# Altium footprint library Indruino.PcbLib: 383 footprints (part 15 of 24)
Each footprint in its own frame and in the unit in brackets; x right, y up, seen from the top. Pads: shape width x height; smd on the part's side, far side on the other; paste and mask are expansions set on the pad; w line width, h text height; cw(c..) or ccw(c..) is an arc to the next point about the centre after c.
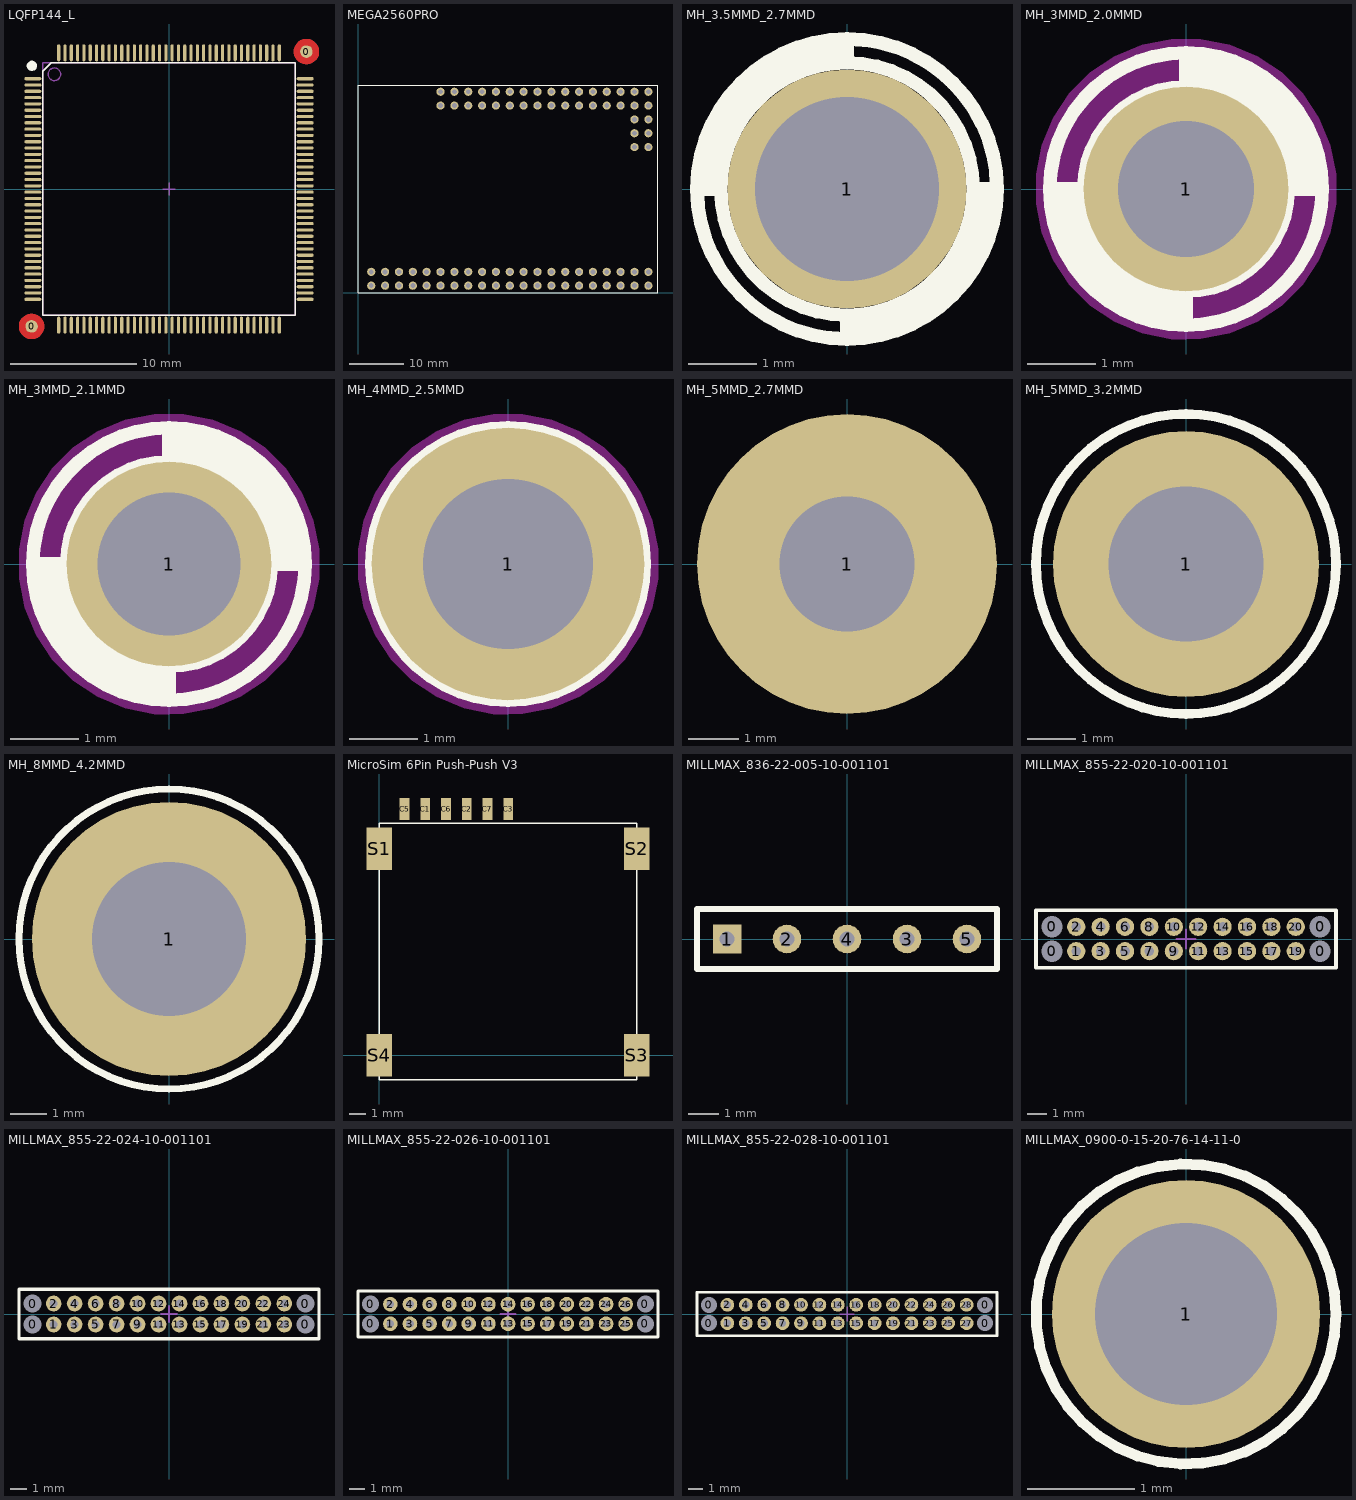
[diagram p14: the footprints below, top view; thin cyan lines are the x and y axes]

## LQFP144_L [mm] "Thin QFP, 144-Leads, Body 20x20mm, Pitch 0.5mm, IPC High Density"
height 1.6
pads (146):
  round 1 smd mask+0.5: 0(-10.9,-10.9) 0(10.9,10.9)
  oval 1.35x0.25 smd: 1(-10.8,8.75) 2(-10.8,8.25) 3(-10.8,7.75) 4(-10.8,7.25) 5(-10.8,6.75) 6(-10.8,6.25) 7(-10.8,5.75) 8(-10.8,5.25) 9(-10.8,4.75) 10(-10.8,4.25) 11(-10.8,3.75) 12(-10.8,3.25) 13(-10.8,2.75) 14(-10.8,2.25) 15(-10.8,1.75) 16(-10.8,1.25) 17(-10.8,0.75) 18(-10.8,0.25) 19(-10.8,-0.25) 20(-10.8,-0.75) 21(-10.8,-1.25) 22(-10.8,-1.75) 23(-10.8,-2.25) 24(-10.8,-2.75) 25(-10.8,-3.25) 26(-10.8,-3.75) 27(-10.8,-4.25) 28(-10.8,-4.75) 29(-10.8,-5.25) 30(-10.8,-5.75) 31(-10.8,-6.25) 32(-10.8,-6.75) 33(-10.8,-7.25) 34(-10.8,-7.75) 35(-10.8,-8.25) 36(-10.8,-8.75) 73(10.8,-8.75) 74(10.8,-8.25) 75(10.8,-7.75) 76(10.8,-7.25) 77(10.8,-6.75) 78(10.8,-6.25) 79(10.8,-5.75) 80(10.8,-5.25) 81(10.8,-4.75) 82(10.8,-4.25) 83(10.8,-3.75) 84(10.8,-3.25) 85(10.8,-2.75) 86(10.8,-2.25) 87(10.8,-1.75) 88(10.8,-1.25) 89(10.8,-0.75) 90(10.8,-0.25) 91(10.8,0.25) 92(10.8,0.75) 93(10.8,1.25) 94(10.8,1.75) 95(10.8,2.25) 96(10.8,2.75) 97(10.8,3.25) 98(10.8,3.75) 99(10.8,4.25) 100(10.8,4.75) 101(10.8,5.25) 102(10.8,5.75) 103(10.8,6.25) 104(10.8,6.75) 105(10.8,7.25) 106(10.8,7.75) 107(10.8,8.25) 108(10.8,8.75)
  oval 0.25x1.35 smd: 37(-8.75,-10.8) 38(-8.25,-10.8) 39(-7.75,-10.8) 40(-7.25,-10.8) 41(-6.75,-10.8) 42(-6.25,-10.8) 43(-5.75,-10.8) 44(-5.25,-10.8) 45(-4.75,-10.8) 46(-4.25,-10.8) 47(-3.75,-10.8) 48(-3.25,-10.8) 49(-2.75,-10.8) 50(-2.25,-10.8) 51(-1.75,-10.8) 52(-1.25,-10.8) 53(-0.75,-10.8) 54(-0.25,-10.8) 55(0.25,-10.8) 56(0.75,-10.8) 57(1.25,-10.8) 58(1.75,-10.8) 59(2.25,-10.8) 60(2.75,-10.8) 61(3.25,-10.8) 62(3.75,-10.8) 63(4.25,-10.8) 64(4.75,-10.8) 65(5.25,-10.8) 66(5.75,-10.8) 67(6.25,-10.8) 68(6.75,-10.8) 69(7.25,-10.8) 70(7.75,-10.8) 71(8.25,-10.8) 72(8.75,-10.8) 109(8.75,10.8) 110(8.25,10.8) 111(7.75,10.8) 112(7.25,10.8) 113(6.75,10.8) 114(6.25,10.8) 115(5.75,10.8) 116(5.25,10.8) 117(4.75,10.8) 118(4.25,10.8) 119(3.75,10.8) 120(3.25,10.8) 121(2.75,10.8) 122(2.25,10.8) 123(1.75,10.8) 124(1.25,10.8) 125(0.75,10.8) 126(0.25,10.8) 127(-0.25,10.8) 128(-0.75,10.8) 129(-1.25,10.8) 130(-1.75,10.8) 131(-2.25,10.8) 132(-2.75,10.8) 133(-3.25,10.8) 134(-3.75,10.8) 135(-4.25,10.8) 136(-4.75,10.8) 137(-5.25,10.8) 138(-5.75,10.8) 139(-6.25,10.8) 140(-6.75,10.8) 141(-7.25,10.8) 142(-7.75,10.8) 143(-8.25,10.8) 144(-8.75,10.8)
Top Layer:
  pour cut-out: -10.9,-9.9 -10.802,-9.9 -10.608,-9.938 -10.426,-10.014 -10.263,-10.123 -10.123,-10.263 -10.014,-10.426 -9.938,-10.608 -9.9,-10.802 -9.9,-10.9 -9.9,-10.998 -9.938,-11.192 -10.014,-11.374 -10.123,-11.537 -10.263,-11.677 -10.426,-11.786 -10.608,-11.862 -10.802,-11.9 -10.9,-11.9 -10.998,-11.9 -11.192,-11.862 -11.374,-11.786 -11.537,-11.677 -11.677,-11.537 -11.786,-11.374 -11.862,-11.192 -11.9,-10.998 -11.9,-10.9 -11.9,-10.802 -11.862,-10.608 -11.786,-10.426 -11.677,-10.263 -11.537,-10.123 -11.374,-10.014 -11.192,-9.938 -10.998,-9.9
  pour cut-out: 10.9,9.9 10.802,9.9 10.608,9.938 10.426,10.014 10.263,10.123 10.123,10.263 10.014,10.426 9.938,10.608 9.9,10.802 9.9,10.9 9.9,10.998 9.938,11.192 10.014,11.374 10.123,11.537 10.263,11.677 10.426,11.786 10.608,11.862 10.802,11.9 10.9,11.9 10.998,11.9 11.192,11.862 11.374,11.786 11.537,11.677 11.677,11.537 11.786,11.374 11.862,11.192 11.9,10.998 11.9,10.9 11.9,10.802 11.862,10.608 11.786,10.426 11.677,10.263 11.537,10.123 11.374,10.014 11.192,9.938 10.998,9.9
Top Overlay:
  region: -10.878,9.367 -10.957,9.367 -11.104,9.428 -11.217,9.541 -11.278,9.688 -11.278,9.767 -11.278,9.847 -11.217,9.994 -11.104,10.107 -10.957,10.167 -10.878,10.167 -10.798,10.167 -10.651,10.107 -10.539,9.994 -10.478,9.847 -10.478,9.767 -10.478,9.688 -10.539,9.541 -10.651,9.428 -10.798,9.367
  lines w0.1: -10,-10 10,-10 10,10 -9.35,10 -10,9.35 -10,-10
Mechanical 13:
  circle w0.1: c-9.1,9.1 r0.5
  lines w0.1: -10,-10 -10,10 10,10 10,-10 -10,-10
Mechanical 15:
  lines w0.1: -0.5,0 0.5,0 ; 0,-0.5 0,0.5
3D body "User Library-LQFP144-0_5.STEP": height 1.56, standoff -0.01, extent -10.886,-10.886 10.886,10.886

## MEGA2560PRO [mm]
pads (80):
  round 1.5 hole 0.9: 3V3@1(10.05,1.28) 3V3@2(10.05,3.82) 5V@1(7.51,1.28) 5V@2(7.51,3.82) A0(15.13,36.84) A1(15.13,34.3) A2(17.67,36.84) A3(17.67,34.3) A4(20.21,36.84) A5(20.21,34.3) A6(22.75,36.84) A7(22.75,34.3) A8(25.29,36.84) A9(25.29,34.3) A10(27.83,36.84) A11(27.83,34.3) A12(30.37,36.84) A13(30.37,34.3) A14(32.91,36.84) A15(32.91,34.3) AREF(12.59,3.82) D2(17.67,3.82) D3(17.67,1.28) D4(20.21,3.82) D5(20.21,1.28) D6(22.75,3.82) D7(22.75,1.28) D8(25.29,3.82) D9(25.29,1.28) D10(27.83,3.82) D11(27.83,1.28) D12(30.37,3.82) D13(30.37,1.28) D14(32.91,3.82) D15(32.91,1.28) D16(35.45,3.82) D17(35.45,1.28) D18(37.99,3.82) D19(37.99,1.28) D20(40.53,3.82) D21(40.53,1.28) D22(43.07,3.82) D23(43.07,1.28) D24(45.61,3.82) D25(45.61,1.28) D26(48.15,3.82) D27(48.15,1.28) D28(50.69,3.82) D29(50.69,1.28) D30(53.23,3.82) D31(53.23,1.28) D32(35.45,36.84) D33(35.45,34.3) D34(37.99,36.84) D35(37.99,34.3) D36(40.53,36.84) D37(40.53,34.3) D38(43.07,36.84) D39(43.07,34.3) D40(45.61,36.84) D41(45.61,34.3) D42(48.15,36.84) D43(48.15,34.3) D44(50.69,36.84) D45(50.69,34.3) D46(53.23,36.84) D47(53.23,34.3) D48(53.23,31.76) D49(50.69,31.76) D50(53.23,29.22) D51(50.69,29.22) D52(53.23,26.68) D53(50.69,26.68) GND@1(4.97,1.28) GND@2(4.97,3.82) RST(12.59,1.28) RX(15.13,3.82) TX(15.13,1.28) VIN@1(2.43,1.28) VIN@2(2.43,3.82)
Top Overlay:
  lines w0.2: 0,38 0,0 55,0 ; 0,38.01 55,38.01 ; 55,0.01 55,37.983
3D body "MEGA2560_PRO_EMBEB.step": height 13.18, standoff -2.14, extent 0,0 55.201,38.211

## MH_3.5MMD_2.7MMD [mm]
pads (1):
  round 3.5 hole 2.7: 1(0,0)
Top Overlay:
  region: -2.2,0 -2.2,0.217 -2.115,0.642 -1.95,1.042 -1.709,1.402 -1.402,1.709 -1.042,1.95 -0.642,2.115 -0.217,2.2 0,2.2 0,1.85 -0.181,1.841 -0.537,1.77 -0.872,1.632 -1.174,1.43 -1.43,1.174 -1.632,0.872 -1.77,0.537 -1.841,0.181 -1.85,0
  region: 0,-2.2 0,-1.85 0.181,-1.841 0.537,-1.77 0.872,-1.632 1.174,-1.43 1.43,-1.174 1.632,-0.872 1.77,-0.537 1.841,-0.181 1.85,0 2.2,0 2.2,-0.217 2.115,-0.642 1.95,-1.042 1.709,-1.402 1.402,-1.709 1.042,-1.95 0.642,-2.115 0.217,-2.2
  lines w0.2: -2.2,0 ccw(c0,0) 0,-2.2 ; -2.2,0 cw(c0,0) 0,2.2 ; -2.2,0 -1.85,0 ; -1.85,0 ccw(c0,0) 0,-1.85 ; -1.85,0 cw(c0,0) 0,1.85 ; 0,-2.2 ccw(c0,0) 2.2,0 ; 0,-2.2 0,-1.85 ; 0,-1.85 ccw(c0,0) 1.85,0 ; 0,1.85 cw(c0,0) 1.85,0 ; 0,1.85 0,2.2 ; 0,2.2 cw(c0,0) 2.2,0 ; 1.85,0 2.2,0
Bottom Overlay:
  region: -2.2,0 -2.2,0.217 -2.115,0.642 -1.95,1.042 -1.709,1.402 -1.402,1.709 -1.042,1.95 -0.642,2.115 -0.217,2.2 0,2.2 0,1.85 -0.181,1.841 -0.537,1.77 -0.872,1.632 -1.174,1.43 -1.43,1.174 -1.632,0.872 -1.77,0.537 -1.841,0.181 -1.85,0
  region: 0,-2.2 0,-1.85 0.181,-1.841 0.537,-1.77 0.872,-1.632 1.174,-1.43 1.43,-1.174 1.632,-0.872 1.77,-0.537 1.841,-0.181 1.85,0 2.2,0 2.2,-0.217 2.115,-0.642 1.95,-1.042 1.709,-1.402 1.402,-1.709 1.042,-1.95 0.642,-2.115 0.217,-2.2
  lines w0.2: -2.2,0 ccw(c0,0) 0,-2.2 ; -2.2,0 cw(c0,0) 0,2.2 ; -2.2,0 -1.85,0 ; -1.85,0 ccw(c0,0) 0,-1.85 ; -1.85,0 cw(c0,0) 0,1.85 ; 0,-2.2 ccw(c0,0) 2.2,0 ; 0,-2.2 0,-1.85 ; 0,-1.85 ccw(c0,0) 1.85,0 ; 0,1.85 cw(c0,0) 1.85,0 ; 0,1.85 0,2.2 ; 0,2.2 cw(c0,0) 2.2,0 ; 1.85,0 2.2,0

## MH_3MMD_2.0MMD [mm]
pads (1):
  round 3 hole 2: 1(0,0)
Top Overlay:
  region: 0,-2 -0.197,-2 -0.583,-1.923 -0.947,-1.772 -1.275,-1.554 -1.554,-1.275 -1.772,-0.947 -1.923,-0.583 -2,-0.197 -2,0 -1.5,0 -1.493,-0.147 -1.435,-0.435 -1.323,-0.707 -1.16,-0.952 -0.952,-1.16 -0.707,-1.323 -0.435,-1.435 -0.147,-1.493 0,-1.5
  region: 0,1.5 0.147,1.493 0.435,1.435 0.707,1.323 0.952,1.16 1.16,0.952 1.323,0.707 1.435,0.435 1.493,0.147 1.5,0 2,0 2,0.197 1.923,0.583 1.772,0.947 1.554,1.275 1.275,1.554 0.947,1.772 0.583,1.923 0.197,2 0,2
  lines w0.2: -2,0 cw(c0,0) 0,2 ; -2,0 ccw(c0,0) 0,-2 ; -2,0 -1.5,0 ; -1.5,0 cw(c0,0) 0,1.5 ; -1.5,0 ccw(c0,0) 0,-1.5 ; 0,-2 ccw(c0,0) 2,0 ; 0,-2 0,-1.5 ; 0,-1.5 ccw(c0,0) 1.5,0 ; 0,1.5 cw(c0,0) 1.5,0 ; 0,1.5 0,2 ; 0,2 cw(c0,0) 2,0 ; 1.5,0 2,0
Bottom Overlay:
  region: 0,-2 -0.197,-2 -0.583,-1.923 -0.947,-1.772 -1.275,-1.554 -1.554,-1.275 -1.772,-0.947 -1.923,-0.583 -2,-0.197 -2,0 -1.5,0 -1.493,-0.147 -1.435,-0.435 -1.323,-0.707 -1.16,-0.952 -0.952,-1.16 -0.707,-1.323 -0.435,-1.435 -0.147,-1.493 0,-1.5
  region: 0,1.5 0.147,1.493 0.435,1.435 0.707,1.323 0.952,1.16 1.16,0.952 1.323,0.707 1.435,0.435 1.493,0.147 1.5,0 2,0 2,0.197 1.923,0.583 1.772,0.947 1.553,1.275 1.275,1.554 0.947,1.772 0.583,1.923 0.197,2 0,2
  lines w0.2: -2,0 ccw(c0,0) 0,-2 ; -2,0 cw(c0,0) 0,2 ; -2,0 -1.5,0 ; -1.5,0 ccw(c0,0) 0,-1.5 ; -1.5,0 cw(c0,0) 0,1.5 ; 0,-2 ccw(c0,0) 2,0 ; 0,-2 0,-1.5 ; 0,-1.5 ccw(c0,0) 1.5,0 ; 0,1.5 cw(c0,0) 1.5,0 ; 0,1.5 0,2 ; 0,2 cw(c0,0) 2,0 ; 1.5,0 2,0
Keep-Out Layer:
  pour cut-out: 0,-2.2 -0.217,-2.2 -0.642,-2.115 -1.042,-1.95 -1.402,-1.709 -1.709,-1.402 -1.95,-1.042 -2.115,-0.642 -2.2,-0.217 -2.2,0 -2.2,0.217 -2.115,0.642 -1.95,1.042 -1.709,1.402 -1.402,1.709 -1.042,1.95 -0.642,2.115 -0.217,2.2 0,2.2 0.217,2.2 0.642,2.115 1.042,1.95 1.402,1.709 1.709,1.402 1.95,1.042 2.115,0.642 2.2,0.217 2.2,0 2.2,-0.217 2.115,-0.642 1.95,-1.042 1.709,-1.402 1.402,-1.709 1.042,-1.95 0.642,-2.115 0.217,-2.2

## MH_3MMD_2.1MMD [mm]
pads (1):
  round 3 hole 2.1: 1(0,0)
Top Overlay:
  region: 0,-2 -0.197,-2 -0.583,-1.923 -0.947,-1.772 -1.275,-1.554 -1.554,-1.275 -1.772,-0.947 -1.923,-0.583 -2,-0.197 -2,0 -1.5,0 -1.493,-0.147 -1.435,-0.435 -1.323,-0.707 -1.16,-0.952 -0.952,-1.16 -0.707,-1.323 -0.435,-1.435 -0.147,-1.493 0,-1.5
  region: 0,1.5 0.147,1.493 0.435,1.435 0.707,1.323 0.952,1.16 1.16,0.952 1.323,0.707 1.435,0.435 1.493,0.147 1.5,0 2,0 2,0.197 1.923,0.583 1.772,0.947 1.554,1.275 1.275,1.554 0.947,1.772 0.583,1.923 0.197,2 0,2
  lines w0.2: -2,0 cw(c0,0) 0,2 ; -2,0 ccw(c0,0) 0,-2 ; -2,0 -1.5,0 ; -1.5,0 cw(c0,0) 0,1.5 ; -1.5,0 ccw(c0,0) 0,-1.5 ; 0,-2 ccw(c0,0) 2,0 ; 0,-2 0,-1.5 ; 0,-1.5 ccw(c0,0) 1.5,0 ; 0,1.5 cw(c0,0) 1.5,0 ; 0,1.5 0,2 ; 0,2 cw(c0,0) 2,0 ; 1.5,0 2,0
Bottom Overlay:
  region: 0,-2 -0.197,-2 -0.583,-1.923 -0.947,-1.772 -1.275,-1.554 -1.554,-1.275 -1.772,-0.947 -1.923,-0.583 -2,-0.197 -2,0 -1.5,0 -1.493,-0.147 -1.435,-0.435 -1.323,-0.707 -1.16,-0.952 -0.952,-1.16 -0.707,-1.323 -0.435,-1.435 -0.147,-1.493 0,-1.5
  region: 0,1.5 0.147,1.493 0.435,1.435 0.707,1.323 0.952,1.16 1.16,0.952 1.323,0.707 1.435,0.435 1.493,0.147 1.5,0 2,0 2,0.197 1.923,0.583 1.772,0.947 1.553,1.275 1.275,1.554 0.947,1.772 0.583,1.923 0.197,2 0,2
  lines w0.2: -2,0 ccw(c0,0) 0,-2 ; -2,0 cw(c0,0) 0,2 ; -2,0 -1.5,0 ; -1.5,0 ccw(c0,0) 0,-1.5 ; -1.5,0 cw(c0,0) 0,1.5 ; 0,-2 ccw(c0,0) 2,0 ; 0,-2 0,-1.5 ; 0,-1.5 ccw(c0,0) 1.5,0 ; 0,1.5 cw(c0,0) 1.5,0 ; 0,1.5 0,2 ; 0,2 cw(c0,0) 2,0 ; 1.5,0 2,0
Keep-Out Layer:
  pour cut-out: 0,-2.2 -0.217,-2.2 -0.642,-2.115 -1.042,-1.95 -1.402,-1.709 -1.709,-1.402 -1.95,-1.042 -2.115,-0.642 -2.2,-0.217 -2.2,0 -2.2,0.217 -2.115,0.642 -1.95,1.042 -1.709,1.402 -1.402,1.709 -1.042,1.95 -0.642,2.115 -0.217,2.2 0,2.2 0.217,2.2 0.642,2.115 1.042,1.95 1.402,1.709 1.709,1.402 1.95,1.042 2.115,0.642 2.2,0.217 2.2,0 2.2,-0.217 2.115,-0.642 1.95,-1.042 1.709,-1.402 1.402,-1.709 1.042,-1.95 0.642,-2.115 0.217,-2.2

## MH_4MMD_2.5MMD [mm]
pads (1):
  round 4 hole 2.5: 1(0,0)
Top Overlay:
  region: 0,1.5 0.147,1.493 0.435,1.435 0.707,1.323 0.952,1.16 1.16,0.952 1.323,0.707 1.435,0.435 1.493,0.147 1.5,0 2,0 2,0.197 1.923,0.583 1.772,0.947 1.554,1.275 1.275,1.554 0.947,1.772 0.583,1.923 0.197,2 0,2
  region: 0,-2 -0.197,-2 -0.583,-1.923 -0.947,-1.772 -1.275,-1.554 -1.554,-1.275 -1.772,-0.947 -1.923,-0.583 -2,-0.197 -2,0 -1.5,0 -1.493,-0.147 -1.435,-0.435 -1.323,-0.707 -1.16,-0.952 -0.952,-1.16 -0.707,-1.323 -0.435,-1.435 -0.147,-1.493 0,-1.5
  lines w0.2: -2,0 ccw(c0,0) 0,-2 ; -2,0 cw(c0,0) 0,2 ; -2,0 -1.5,0 ; -1.5,0 ccw(c0,0) 0,-1.5 ; -1.5,0 cw(c0,0) 0,1.5 ; 0,-2 ccw(c0,0) 2,0 ; 0,-2 0,-1.5 ; 0,-1.5 ccw(c0,0) 1.5,0 ; 0,1.5 cw(c0,0) 1.5,0 ; 0,1.5 0,2 ; 0,2 cw(c0,0) 2,0 ; 1.5,0 2,0
Bottom Overlay:
  region: 0,1.5 0.147,1.493 0.435,1.435 0.707,1.323 0.952,1.16 1.16,0.952 1.323,0.707 1.435,0.435 1.493,0.147 1.5,0 2,0 2,0.197 1.923,0.583 1.772,0.947 1.553,1.275 1.275,1.554 0.947,1.772 0.583,1.923 0.197,2 0,2
  region: 0,-2 -0.197,-2 -0.583,-1.923 -0.947,-1.772 -1.275,-1.554 -1.554,-1.275 -1.772,-0.947 -1.923,-0.583 -2,-0.197 -2,0 -1.5,0 -1.493,-0.147 -1.435,-0.435 -1.323,-0.707 -1.16,-0.952 -0.952,-1.16 -0.707,-1.323 -0.435,-1.435 -0.147,-1.493 0,-1.5
  lines w0.2: -2,0 cw(c0,0) 0,2 ; -2,0 ccw(c0,0) 0,-2 ; -2,0 -1.5,0 ; -1.5,0 cw(c0,0) 0,1.5 ; -1.5,0 ccw(c0,0) 0,-1.5 ; 0,-2 ccw(c0,0) 2,0 ; 0,-2 0,-1.5 ; 0,-1.5 ccw(c0,0) 1.5,0 ; 0,1.5 cw(c0,0) 1.5,0 ; 0,1.5 0,2 ; 0,2 cw(c0,0) 2,0 ; 1.5,0 2,0
Keep-Out Layer:
  pour cut-out: 0,-2.2 -0.217,-2.2 -0.642,-2.115 -1.042,-1.95 -1.402,-1.709 -1.709,-1.402 -1.95,-1.042 -2.115,-0.642 -2.2,-0.217 -2.2,0 -2.2,0.217 -2.115,0.642 -1.95,1.042 -1.709,1.402 -1.402,1.709 -1.042,1.95 -0.642,2.115 -0.217,2.2 0,2.2 0.217,2.2 0.642,2.115 1.042,1.95 1.402,1.709 1.709,1.402 1.95,1.042 2.115,0.642 2.2,0.217 2.2,0 2.2,-0.217 2.115,-0.642 1.95,-1.042 1.709,-1.402 1.402,-1.709 1.042,-1.95 0.642,-2.115 0.217,-2.2

## MH_5MMD_2.7MMD [mm]
pads (1):
  round 6 hole 2.7: 1(0,0)
Keep-Out Layer:
  pour cut-out: 0,-2.2 -0.217,-2.2 -0.642,-2.115 -1.042,-1.95 -1.402,-1.709 -1.709,-1.402 -1.95,-1.042 -2.115,-0.642 -2.2,-0.217 -2.2,0 -2.2,0.217 -2.115,0.642 -1.95,1.042 -1.709,1.402 -1.402,1.709 -1.042,1.95 -0.642,2.115 -0.217,2.2 0,2.2 0.217,2.2 0.642,2.115 1.042,1.95 1.402,1.709 1.709,1.402 1.95,1.042 2.115,0.642 2.2,0.217 2.2,0 2.2,-0.217 2.115,-0.642 1.95,-1.042 1.709,-1.402 1.402,-1.709 1.042,-1.95 0.642,-2.115 0.217,-2.2

## MH_5MMD_3.2MMD [mm]
pads (1):
  round 5.5 hole 3.2: 1(0,0)
Top Overlay:
  lines w0.2: -3.1,0 ccw(c0,0) 0,-3.1 ccw(c0,0) 3.1,0 ccw(c0,0) 0,3.1 ccw(c0,0) -3.1,0
Bottom Overlay:
  lines w0.2: -3.1,0 cw(c0,0) 0,3.1 cw(c0,0) 3.1,0 cw(c0,0) 0,-3.1 cw(c0,0) -3.1,0

## MH_8MMD_4.2MMD [mm]
pads (1):
  round 7.5 hole 4.2: 1(0,0)
Top Overlay:
  lines w0.2: -4.1,0 ccw(c0,0) 0,-4.1 ccw(c0,0) 4.1,0 ccw(c0,0) 0,4.1 ccw(c0,0) -4.1,0
Bottom Overlay:
  lines w0.2: -4.1,0 cw(c0,0) 0,4.1 cw(c0,0) 4.1,0 cw(c0,0) 0,-4.1 cw(c0,0) -4.1,0

## MicroSim 6Pin Push-Push V3 [mm] "https://www.thegioiic.com/products/khe-cam-microsim-6pin-push-push-v3"
height 1.22
pads (10):
  rect 0.6x1.35 smd: C1(2.83,15.105) C2(5.37,15.105) C3(7.91,15.105) C5(1.56,15.105) C6(4.1,15.105) C7(6.64,15.105)
  rect 1.55x2.6 smd: S1(0,12.68) S2(15.8,12.68) S3(15.8,0) S4(0,0)
Top Overlay:
  lines w0.1: 0,-1.5 15.8,-1.5 15.8,14.25 0,14.25 0,-1.5
3D body "User Library-115Q-BCA0_C_1-2.STEP": height 1.63, standoff -0.73, extent -0.75,-1.5 16.54,16.575

## MILLMAX_836-22-005-10-001101 [mm] "2MM PITCH, SINGLE ROW, THRU-HOLE"
pads (5):
  rect 0.95x0.95 hole 0.5: 1(-4,0)
  round 0.95 hole 0.5: 2(-2,0) 3(2,0) 4(0,0) 5(4,0)
Top Overlay:
  lines w0.2: -5,-1 5,-1 5,1 -5,1 -5,-1

## MILLMAX_855-22-020-10-001101 [mm] "Connector; Header; 20 Position"
pads (24):
  round 1 hole 1.1: 0(-6.985,-0.635) 0(-6.985,0.635) 0(6.985,-0.635) 0(6.985,0.635)
  round 0.95 hole 0.5: 1(-5.715,-0.635) 2(-5.715,0.635) 3(-4.445,-0.635) 4(-4.445,0.635) 5(-3.175,-0.635) 6(-3.175,0.635) 7(-1.905,-0.635) 8(-1.905,0.635) 9(-0.635,-0.635) 10(-0.635,0.635) 11(0.635,-0.635) 12(0.635,0.635) 13(1.905,-0.635) 14(1.905,0.635) 15(3.175,-0.635) 16(3.175,0.635) 17(4.445,-0.635) 18(4.445,0.635) 19(5.715,-0.635) 20(5.715,0.635)
Top Overlay:
  lines w0.2: -7.81,-1.5 -7.81,1.5 7.81,1.5 7.81,-1.5 -7.81,-1.5
Mechanical 15:
  lines w0.1: -0.5,0 0.5,0 ; 0,-0.5 0,0.5
3D body "tiep diem 855_20pin.STEP": height 5.29, standoff -2.6, extent -7.81,-1.5 7.81,1.5

## MILLMAX_855-22-024-10-001101 [mm] "Connector; Header; 24 Position"
pads (28):
  round 1 hole 1.1: 0(-8.255,-0.635) 0(-8.255,0.635) 0(8.255,-0.635) 0(8.255,0.635)
  round 0.95 hole 0.5: 1(-6.985,-0.635) 2(-6.985,0.635) 3(-5.715,-0.635) 4(-5.715,0.635) 5(-4.445,-0.635) 6(-4.445,0.635) 7(-3.175,-0.635) 8(-3.175,0.635) 9(-1.905,-0.635) 10(-1.905,0.635) 11(-0.635,-0.635) 12(-0.635,0.635) 13(0.635,-0.635) 14(0.635,0.635) 15(1.905,-0.635) 16(1.905,0.635) 17(3.175,-0.635) 18(3.175,0.635) 19(4.445,-0.635) 20(4.445,0.635) 21(5.715,-0.635) 22(5.715,0.635) 23(6.985,-0.635) 24(6.985,0.635)
Top Overlay:
  lines w0.2: -9.08,-1.5 -9.08,1.5 9.08,1.5 9.08,-1.5 -9.08,-1.5
Mechanical 15:
  lines w0.1: -0.5,0 0.5,0 ; 0,-0.5 0,0.5
3D body "tiep diem 855_24pin.STEP": height 5.29, standoff -2.58, extent -9.08,-1.5 9.08,1.5

## MILLMAX_855-22-026-10-001101 [mm] "Connector; Header; 26 Position"
pads (30):
  round 1 hole 1.1: 0(-8.89,-0.635) 0(-8.89,0.635) 0(8.89,-0.635) 0(8.89,0.635)
  round 0.95 hole 0.5: 1(-7.62,-0.635) 2(-7.62,0.635) 3(-6.35,-0.635) 4(-6.35,0.635) 5(-5.08,-0.635) 6(-5.08,0.635) 7(-3.81,-0.635) 8(-3.81,0.635) 9(-2.54,-0.635) 10(-2.54,0.635) 11(-1.27,-0.635) 12(-1.27,0.635) 13(0,-0.635) 14(0,0.635) 15(1.27,-0.635) 16(1.27,0.635) 17(2.54,-0.635) 18(2.54,0.635) 19(3.81,-0.635) 20(3.81,0.635) 21(5.08,-0.635) 22(5.08,0.635) 23(6.35,-0.635) 24(6.35,0.635) 25(7.62,-0.635) 26(7.62,0.635)
Top Overlay:
  lines w0.2: -9.715,-1.5 9.715,-1.5 9.715,1.5 -9.715,1.5 -9.715,-1.5
Mechanical 15:
  lines w0.1: -0.5,0 0.5,0 ; 0,-0.5 0,0.5
3D body "tiep diem 855_24pin.STEP": height 5.29, standoff -2.58, extent -9.08,-1.5 9.08,1.5

## MILLMAX_855-22-028-10-001101 [mm] "Connector; Header; 28 Position"
pads (32):
  round 1 hole 1.1: 0(-9.525,-0.635) 0(-9.525,0.635) 0(9.525,-0.635) 0(9.525,0.635)
  round 0.95 hole 0.5: 1(-8.255,-0.635) 2(-8.255,0.635) 3(-6.985,-0.635) 4(-6.985,0.635) 5(-5.715,-0.635) 6(-5.715,0.635) 7(-4.445,-0.635) 8(-4.445,0.635) 9(-3.175,-0.635) 10(-3.175,0.635) 11(-1.905,-0.635) 12(-1.905,0.635) 13(-0.635,-0.635) 14(-0.635,0.635) 15(0.635,-0.635) 16(0.635,0.635) 17(1.905,-0.635) 18(1.905,0.635) 19(3.175,-0.635) 20(3.175,0.635) 21(4.445,-0.635) 22(4.445,0.635) 23(5.715,-0.635) 24(5.715,0.635) 25(6.985,-0.635) 26(6.985,0.635) 27(8.255,-0.635) 28(8.255,0.635)
Top Overlay:
  lines w0.2: -10.35,-1.5 10.35,-1.5 10.35,1.5 -10.35,1.5 -10.35,-1.5
Mechanical 15:
  lines w0.1: -0.5,0 0.5,0 ; 0,-0.5 0,0.5
3D body "tiep diem 855_24pin.STEP": height 5.29, standoff -2.58, extent -9.08,-1.5 9.08,1.5

## MILLMAX_0900-0-15-20-76-14-11-0 [mm]
pads (1):
  round 2.5 hole 1.7: 1(0,0)
Top Overlay:
  circle w0.1: c0,0 r1.4
3D body "mill-max-0906-0-15-20-76-14-11-0.STEP": height 0.73, standoff -4.5, extent -0.914,-0.914 0.914,0.914